# Altium footprint library SomoPowerPackControl.PcbLib: 145 footprints (part 3 of 10)
Each footprint in its own frame and in the unit in brackets; x right, y up, seen from the top. Pads: shape width x height; smd on the part's side, far side on the other; paste and mask are expansions set on the pad; w line width, h text height; cw(c..) or ccw(c..) is an arc to the next point about the centre after c.
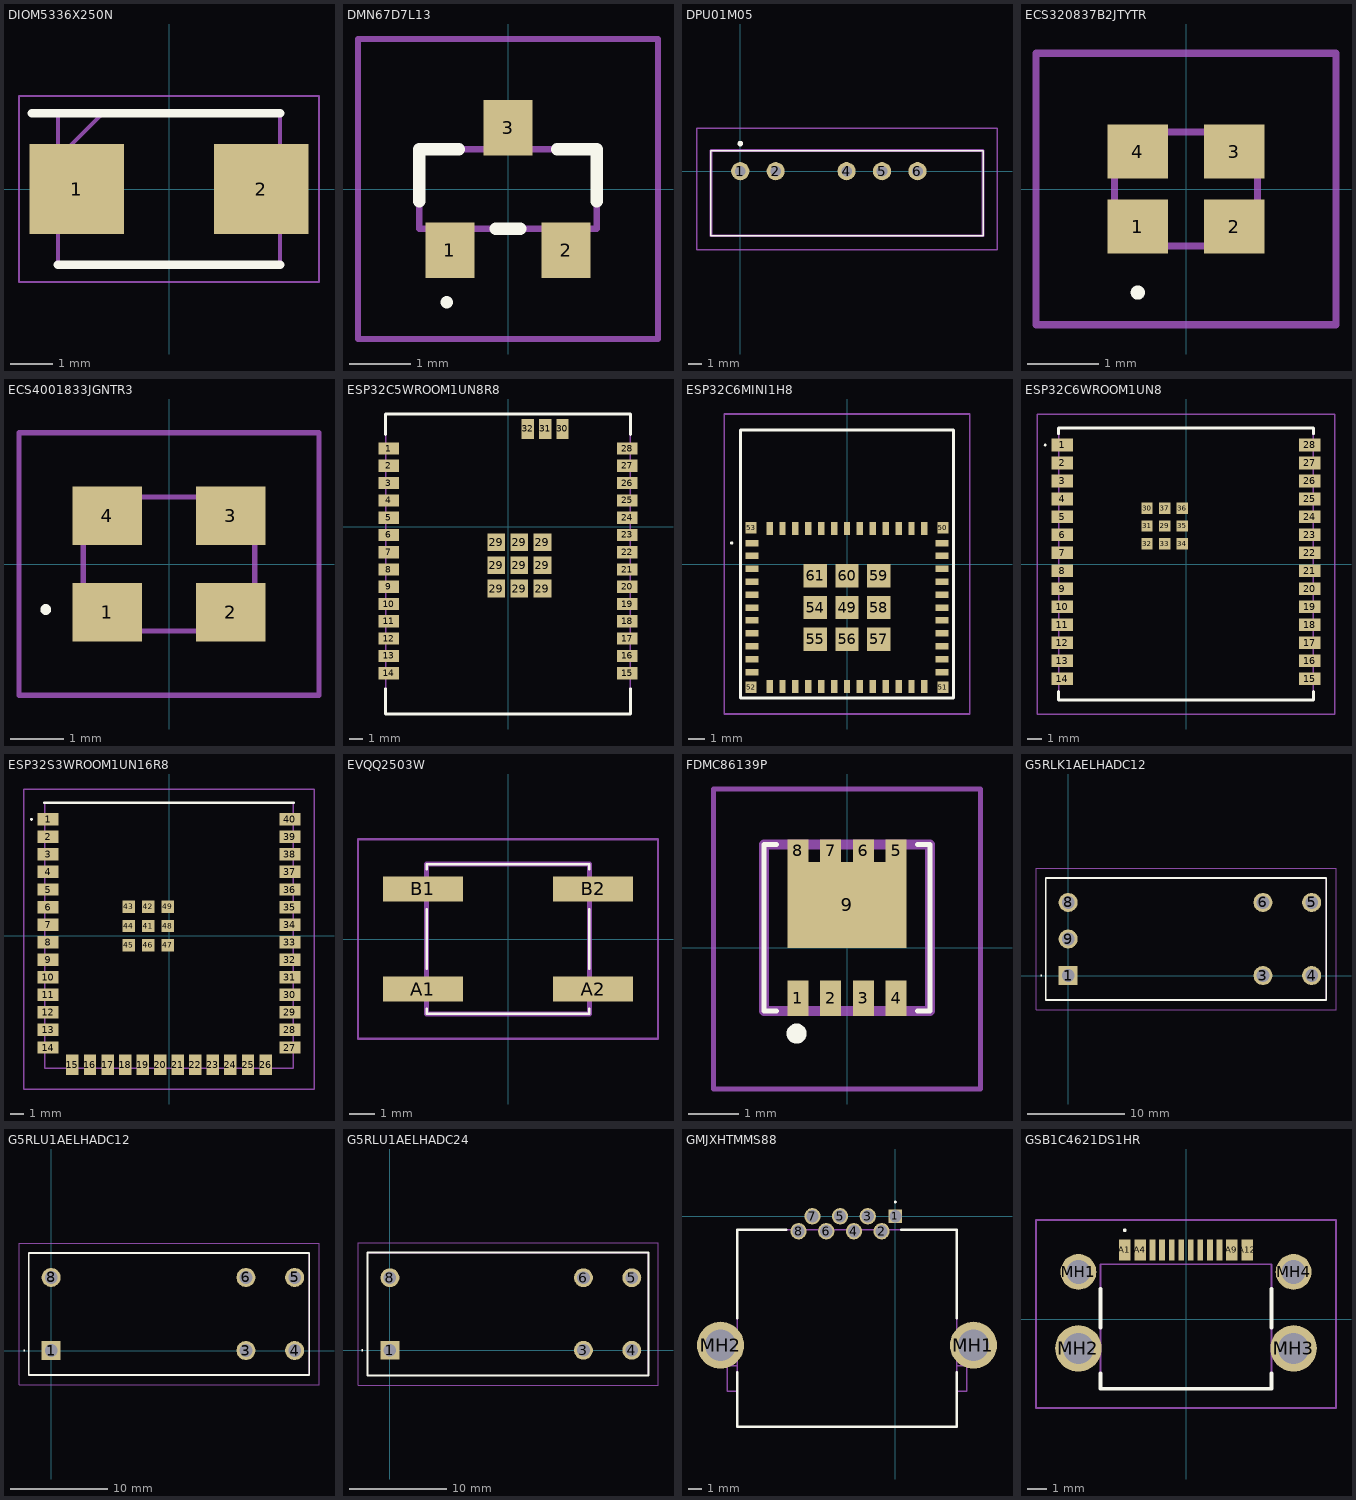
[diagram p2: the footprints below, top view; thin cyan lines are the x and y axes]

## DIOM5336X250N [mm]
pads (2):
  rect 2.25x2.15 smd: 1(-2.2,0) 2(2.2,0)
Top Overlay:
  lines w0.2: -3.275,1.81 2.648,1.81 ; -2.648,-1.81 2.648,-1.81
Mechanical 13:
  lines w0.1: -2.648,0.735 -1.572,1.81 ; -2.648,-1.81 2.648,-1.81 2.648,1.81 -2.648,1.81 -2.648,-1.81
Mechanical 15:
  lines w0.05: -3.575,-2.22 3.575,-2.22 3.575,2.22 -3.575,2.22 -3.575,-2.22
3D body "B360BQ-13-F.stp": height 2.3, standoff 0, extent -2.679,-1.752 2.681,1.748

## DMN67D7L13 [mm]
pads (3):
  rect 0.8x0.9 smd: 1(-0.95,-1) 2(0.95,-1) 3(0,1)
Top Overlay:
  lines w0.1: -1,-1.9 cw(c-1,-1.85) -1,-1.8 cw(c-1,-1.85) -1,-1.9
  lines w0.2: -1.45,-0.2 -1.45,0.65 -0.8,0.65 ; -0.2,-0.65 0.2,-0.65 ; 0.8,0.65 1.45,0.65 1.45,-0.2
Mechanical 13:
  lines w0.1: -1.45,-0.65 1.45,-0.65 1.45,0.65 -1.45,0.65 -1.45,-0.65
Mechanical 15:
  lines w0.1: -2.45,-2.45 2.45,-2.45 2.45,2.45 -2.45,2.45 -2.45,-2.45
3D body "DMN67D7L-13.stp": height 1.2, standoff 0, extent -1.45,-1.37 1.45,1.37

## DPU01M05 [mm]
pads (5):
  round 1.303 hole 0.76: 1(0,0) 2(2.54,0) 4(7.62,0) 5(10.16,0) 6(12.7,0)
Top Overlay:
  lines w0.1: -2.1,-4.625 17.4,-4.625 17.4,1.475 -2.1,1.475 -2.1,-4.625
  lines w0.2: -0.1,1.975 cw(c0,1.975) 0.1,1.975 cw(c0,1.975) -0.1,1.975
Mechanical 13:
  lines w0.2: -2.1,-4.625 17.4,-4.625 17.4,1.475 -2.1,1.475 -2.1,-4.625
Mechanical 15:
  lines w0.1: -3.1,-5.625 18.4,-5.625 18.4,3.075 -3.1,3.075 -3.1,-5.625
3D body "SPU01M-05.stp": height 10.2, standoff -3.2, extent -2.34,-5.52 17.16,1.68

## ECS320837B2JTYTR [mm]
pads (4):
  rect 0.85x0.75 smd: 1(-0.675,-0.525) 2(0.675,-0.525) 3(0.675,0.525) 4(-0.675,0.525)
Top Overlay:
  lines w0.1: -0.675,-1.5 cw(c-0.675,-1.45) -0.675,-1.4 cw(c-0.675,-1.45) -0.675,-1.5
Mechanical 13:
  lines w0.1: -1,-0.8 1,-0.8 1,0.8 -1,0.8 -1,-0.8
Mechanical 15:
  lines w0.1: -2.1,-1.9 2.1,-1.9 2.1,1.9 -2.1,1.9 -2.1,-1.9
3D body "ECS-320-8-37B2-JTY-TR.stp": height 0.6, standoff 0, extent -1.025,-0.825 1.025,0.825

## ECS4001833JGNTR3 [mm]
pads (4):
  rect 1.3x1.1 smd: 1(-1.15,-0.9) 2(1.15,-0.9) 3(1.15,0.9) 4(-1.15,0.9)
Top Overlay:
  lines w0.1: -2.3,-0.9 ccw(c-2.3,-0.85) -2.3,-0.8 ccw(c-2.3,-0.85) -2.3,-0.9
Mechanical 13:
  lines w0.1: -1.6,-1.25 1.6,-1.25 1.6,1.25 -1.6,1.25 -1.6,-1.25
Mechanical 15:
  lines w0.1: -2.8,-2.45 2.8,-2.45 2.8,2.45 -2.8,2.45 -2.8,-2.45
3D body "ECS-400-18-33-JGN-TR3.stp": height 0.9, standoff 0, extent -1.69,-1.34 1.69,1.34

## ESP32C5WROOM1UN8R8 [mm]
pads (40):
  rect 1.5x0.9 smd: 1(-8.75,5.76) 2(-8.75,4.49) 3(-8.75,3.22) 4(-8.75,1.95) 5(-8.75,0.68) 6(-8.75,-0.59) 7(-8.75,-1.86) 8(-8.75,-3.13) 9(-8.75,-4.4) 10(-8.75,-5.67) 11(-8.75,-6.94) 12(-8.75,-8.21) 13(-8.75,-9.48) 14(-8.75,-10.75) 15(8.75,-10.75) 16(8.75,-9.48) 17(8.75,-8.21) 18(8.75,-6.94) 19(8.75,-5.67) 20(8.75,-4.4) 21(8.75,-3.13) 22(8.75,-1.86) 23(8.75,-0.59) 24(8.75,0.68) 25(8.75,1.95) 26(8.75,3.22) 27(8.75,4.49) 28(8.75,5.76)
  rect 1.3x1.3 smd: 29(-0.87,-4.528) 29(-0.87,-2.828) 29(-0.87,-1.128) 29(0.83,-4.528) 29(0.83,-2.828) 29(0.83,-1.128) 29(2.53,-4.528) 29(2.53,-2.828) 29(2.53,-1.128)
  rect 0.9x1.5 smd: 30(4,7.2) 31(2.73,7.2) 32(1.46,7.2)
Top Overlay:
  lines w0.2: -9,-11.9 -9,-13.75 9,-13.75 9,-11.9 ; -9,6.8 -9,8.3 9,8.3 9,6.8
Mechanical 13:
  lines w0.1: -9,-13.75 9,-13.75 9,8.3 -9,8.3 -9,-13.75
3D body "ESP32-C5-WROOM-1-N8R8.stp": height 3.45, standoff 0, extent -9,-13.75 9,7.45

## ESP32C6MINI1H8 [mm]
pads (61):
  rect 0.8x0.4 smd: 1(-5.9,1.3) 2(-5.9,0.5) 3(-5.9,-0.3) 4(-5.9,-1.1) 5(-5.9,-1.9) 6(-5.9,-2.7) 7(-5.9,-3.5) 8(-5.9,-4.3) 9(-5.9,-5.1) 10(-5.9,-5.9) 11(-5.9,-6.7) 25(5.9,-6.7) 26(5.9,-5.9) 27(5.9,-5.1) 28(5.9,-4.3) 29(5.9,-3.5) 30(5.9,-2.7) 31(5.9,-1.9) 32(5.9,-1.1) 33(5.9,-0.3) 34(5.9,0.5) 35(5.9,1.3)
  rect 0.4x0.8 smd: 12(-4.8,-7.6) 13(-4,-7.6) 14(-3.2,-7.6) 15(-2.4,-7.6) 16(-1.6,-7.6) 17(-0.8,-7.6) 18(0,-7.6) 19(0.8,-7.6) 20(1.6,-7.6) 21(2.4,-7.6) 22(3.2,-7.6) 23(4,-7.6) 24(4.8,-7.6) 36(4.8,2.2) 37(4,2.2) 38(3.2,2.2) 39(2.4,2.2) 40(1.6,2.2) 41(0.8,2.2) 42(0,2.2) 43(-0.8,2.2) 44(-1.6,2.2) 45(-2.4,2.2) 46(-3.2,2.2) 47(-4,2.2) 48(-4.8,2.2)
  rect 1.45x1.45 smd: 49(0,-2.7) 54(-1.975,-2.7) 55(-1.975,-4.675) 56(0,-4.675) 57(1.975,-4.675) 58(1.975,-2.7) 59(1.975,-0.725) 60(0,-0.725) 61(-1.975,-0.725)
  rect 0.7x0.7 smd: 50(5.95,2.25) 51(5.95,-7.65) 52(-5.95,-7.65) 53(-5.95,2.25)
Top Overlay:
  lines w0.1: -7.2,1.3 ccw(c-7.15,1.3) -7.1,1.3 ccw(c-7.15,1.3) -7.2,1.3
  lines w0.2: -6.6,-8.3 -6.6,8.3 6.6,8.3 6.6,-8.3 -6.6,-8.3
Mechanical 13:
  lines w0.1: -6.6,-8.3 -6.6,8.3 6.6,8.3 6.6,-8.3 -6.6,-8.3
Mechanical 15:
  lines w0.1: -7.6,-9.3 -7.6,9.3 7.6,9.3 7.6,-9.3 -7.6,-9.3
3D body "ESP32-C6-MINI-1-H8.stp": height 2.55, standoff 0, extent -6.6,-8.3 6.6,8.3

## ESP32C6WROOM1UN8 [mm]
pads (37):
  rect 1.5x0.9 smd: 1(-8.75,8.41) 2(-8.75,7.14) 3(-8.75,5.87) 4(-8.75,4.6) 5(-8.75,3.33) 6(-8.75,2.06) 7(-8.75,0.79) 8(-8.75,-0.48) 9(-8.75,-1.75) 10(-8.75,-3.02) 11(-8.75,-4.29) 12(-8.75,-5.56) 13(-8.75,-6.83) 14(-8.75,-8.1) 15(8.75,-8.1) 16(8.75,-6.83) 17(8.75,-5.56) 18(8.75,-4.29) 19(8.75,-3.02) 20(8.75,-1.75) 21(8.75,-0.48) 22(8.75,0.79) 23(8.75,2.06) 24(8.75,3.33) 25(8.75,4.6) 26(8.75,5.87) 27(8.75,7.14) 28(8.75,8.41)
  rect 0.8x0.8 smd: 29(-1.505,2.69) 30(-2.755,3.94) 31(-2.755,2.69) 32(-2.755,1.44) 33(-1.505,1.44) 34(-0.255,1.44) 35(-0.255,2.69) 36(-0.255,3.94) 37(-1.505,3.94)
Top Overlay:
  lines w0.1: -10,8.41 ccw(c-9.95,8.41) -9.9,8.41 ccw(c-9.95,8.41) -10,8.41
  lines w0.2: -9,-9 -9,-9.6 9,-9.6 9,-9 ; -9,9.2 -9,9.6 9,9.6 9,9.2
Mechanical 13:
  lines w0.1: -9,-9.6 9,-9.6 9,9.6 -9,9.6 -9,-9.6
Mechanical 15:
  lines w0.1: -10.5,-10.6 10.5,-10.6 10.5,10.6 -10.5,10.6 -10.5,-10.6
3D body "ESP32-C6-WROOM-1U-N8.stp": height 3.19, standoff 0, extent -9,-9.5 9,9.5

## ESP32S3WROOM1UN16R8 [mm]
pads (49):
  rect 1.5x0.9 smd: 1(-8.75,8.41) 2(-8.75,7.14) 3(-8.75,5.87) 4(-8.75,4.6) 5(-8.75,3.33) 6(-8.75,2.06) 7(-8.75,0.79) 8(-8.75,-0.48) 9(-8.75,-1.75) 10(-8.75,-3.02) 11(-8.75,-4.29) 12(-8.75,-5.56) 13(-8.75,-6.83) 14(-8.75,-8.1) 27(8.75,-8.1) 28(8.75,-6.83) 29(8.75,-5.56) 30(8.75,-4.29) 31(8.75,-3.02) 32(8.75,-1.75) 33(8.75,-0.48) 34(8.75,0.79) 35(8.75,2.06) 36(8.75,3.33) 37(8.75,4.6) 38(8.75,5.87) 39(8.75,7.14) 40(8.75,8.41)
  rect 0.9x1.5 smd: 15(-6.985,-9.35) 16(-5.715,-9.35) 17(-4.445,-9.35) 18(-3.175,-9.35) 19(-1.905,-9.35) 20(-0.635,-9.35) 21(0.635,-9.35) 22(1.905,-9.35) 23(3.175,-9.35) 24(4.445,-9.35) 25(5.715,-9.35) 26(6.985,-9.35)
  rect 0.9x0.9 smd: 41(-1.5,0.69) 42(-1.5,2.09) 43(-2.9,2.09) 44(-2.9,0.69) 45(-2.9,-0.71) 46(-1.5,-0.71) 47(-0.1,-0.71) 48(-0.1,0.69) 49(-0.1,2.09)
Top Overlay:
  lines w0.1: -10,8.4 ccw(c-9.95,8.4) -9.9,8.4 ccw(c-9.95,8.4) -10,8.4
  lines w0.2: -9,9.6 9,9.6
Mechanical 13:
  lines w0.1: -9,-9.6 9,-9.6 9,9.6 -9,9.6 -9,-9.6
Mechanical 15:
  lines w0.1: -10.5,-11.1 10.5,-11.1 10.5,10.6 -10.5,10.6 -10.5,-11.1
3D body "ESP32-S3-WROOM-1U-N16R8.stp": height 3.35, standoff 0, extent -9,-9.85 9,9.35

## EVQQ2503W [mm]
pads (4):
  rect 3.2x1 smd: A1(-3.4,-2) A2(3.4,-2) B1(-3.4,2) B2(3.4,2)
Top Overlay:
  lines w0.1: -3.25,-2.8 -3.25,-3 3.25,-3 3.25,-2.8 ; -3.25,-1.2 -3.25,1.2 ; -3.25,2.8 -3.25,3 3.25,3 3.25,2.8 ; 3.25,-1.2 3.25,1.2
Mechanical 13:
  lines w0.2: -3.25,-3 -3.25,3 3.25,3 3.25,-3 -3.25,-3
Mechanical 15:
  lines w0.1: -6,-4 -6,4 6,4 6,-4 -6,-4
3D body "EVQ-Q2503W.stp": height 3.1, standoff 0, extent -3.3,-3 3.3,3

## FDMC86139P [mm]
pads (9):
  rect 0.42x0.7 smd: 1(-0.975,-1) 2(-0.325,-1) 3(0.325,-1) 4(0.975,-1)
  rect 0.42x0.45 smd: 5(0.975,1.925) 6(0.325,1.925) 7(-0.325,1.925) 8(-0.975,1.925)
  rect 2.37x1.7 smd: 9(0,0.85)
Top Overlay:
  lines w0.1: -1.4,-1.25 -1.65,-1.25 -1.65,2.05 -1.4,2.05 ; 1.4,-1.25 1.65,-1.25 1.65,2.05 1.4,2.05
  lines w0.2: -1.1,-1.7 ccw(c-1,-1.7) -0.9,-1.7 ccw(c-1,-1.7) -1.1,-1.7
Mechanical 13:
  lines w0.2: -1.65,-1.25 -1.65,2.05 1.65,2.05 1.65,-1.25 -1.65,-1.25
Mechanical 15:
  lines w0.1: -2.65,-2.8 -2.65,3.15 2.65,3.15 2.65,-2.8 -2.65,-2.8
3D body "FDMC86262P.stp": height 0.85, standoff 0, extent -1.65,-1.25 1.65,2.05

## G5RLK1AELHADC12 [mm]
pads (7):
  rect 1.95x1.95 hole 1.3: 1(0,0)
  round 1.95 hole 1.3: 3(20,0) 4(25,0) 5(25,7.5) 6(20,7.5) 8(0,7.5) 9(0,3.75)
Top Overlay:
  lines w0.1: -2.8,0 cw(c-2.75,0) -2.7,0 cw(c-2.75,0) -2.8,0
  lines w0.2: -2.1,10 -2.3,10 ; -2.3,10 26.5,10 26.5,-2.5 -2.3,-2.5 -2.3,10
Mechanical 13:
  lines w0.1: -2.3,-2.5 -2.3,10 26.5,10 26.5,-2.5 -2.3,-2.5
Mechanical 15:
  lines w0.1: -3.3,-3.5 -3.3,11 27.5,11 27.5,-3.5 -3.3,-3.5
3D body "G5RL-U1A-EL-HA_DC12.stp": height 15.8, standoff -5, extent -2.3,-2.5 26.5,10

## G5RLU1AELHADC12 [mm]
pads (6):
  rect 1.95x1.95 hole 1.3: 1(0,0)
  round 1.95 hole 1.3: 3(20,0) 4(25,0) 5(25,7.5) 6(20,7.5) 8(0,7.5)
Top Overlay:
  lines w0.1: -2.8,0 cw(c-2.75,0) -2.7,0 cw(c-2.75,0) -2.8,0
  lines w0.2: -2.1,10 -2.3,10 ; -2.3,10 26.5,10 26.5,-2.5 -2.3,-2.5 -2.3,10
Mechanical 13:
  lines w0.1: -2.3,-2.5 -2.3,10 26.5,10 26.5,-2.5 -2.3,-2.5
Mechanical 15:
  lines w0.1: -3.3,-3.5 -3.3,11 27.5,11 27.5,-3.5 -3.3,-3.5
3D body "G5RL-U1A-EL-HA_DC12.stp": height 15.8, standoff -5, extent -2.3,-2.5 26.5,10

## G5RLU1AELHADC24 [mm]
pads (6):
  rect 1.95x1.95 hole 1.3: 1(0,0)
  round 1.95 hole 1.3: 3(20,0) 4(25,0) 5(25,7.5) 6(20,7.5) 8(0,7.5)
Top Overlay:
  lines w0.1: -2.9,0 cw(c-2.85,0) -2.8,0 cw(c-2.85,0) -2.9,0
  lines w0.2: -2.3,-2.6 26.7,-2.6 26.7,10.1 -2.3,10.1 -2.3,-2.6
Mechanical 13:
  lines w0.1: -2.3,-2.6 26.7,-2.6 26.7,10.1 -2.3,10.1 -2.3,-2.6
Mechanical 15:
  lines w0.1: -3.3,-3.6 27.7,-3.6 27.7,11.1 -3.3,11.1 -3.3,-3.6
3D body "G5RL-U1A-EL-HA_DC24.stp": height 15.8, standoff -5, extent -2.3,-2.6 26.7,10.1

## GMJXHTMMS88 [mm]
pads (10):
  rect 1x1 hole 0.9: 1(0,0)
  round 1.2 hole 0.9: 2(-1.02,-1.1) 3(-2.04,0) 4(-3.06,-1.1) 5(-4.08,0) 6(-5.1,-1.1) 7(-6.12,0) 8(-7.14,-1.1)
  round 3.465 hole 2.31: MH1(5.751,-9.5) MH2(-12.889,-9.5)
Top Overlay:
  lines w0.1: 0,1 cw(c0,1.05) 0,1.1 cw(c0,1.05) 0,1
  lines w0.2: -11.659,-11.5 -11.659,-15.5 4.521,-15.5 4.521,-11.5 ; -11.659,-7.5 -11.659,-1 -8.069,-1 ; 0.43,-1 4.521,-1 4.521,-7.5
Mechanical 13:
  lines w0.1: -11.659,-12.9 -12.409,-12.9 -12.409,-11 -11.659,-11 ; 4.521,-12.9 5.271,-12.9 5.271,-11 4.521,-11 ; -11.659,-15.5 -11.659,-1 4.521,-1 4.521,-15.5 -11.659,-15.5
3D body "GMJXHT-MM-S-88.STEP": height 8.8, standoff -1.9, extent -13.065,-15.338 6.065,0.337

## GSB1C4621DS1HR [mm]
pads (16):
  rect 0.6x1.1 smd: A1(-3.2,3.625) A4(-2.4,3.625) A9(2.4,3.625) A12(3.2,3.625)
  rect 0.3x1.1 smd: A5(-1.25,3.625) A6(-0.25,3.625) A7(0.25,3.625) A8(1.25,3.625) B5(1.75,3.625) B6(0.75,3.625) B7(-0.75,3.625) B8(-1.75,3.625)
  round 1.875 hole 1.25: MH1(-5.62,2.475) MH4(5.62,2.475)
  round 2.43 hole 1.62: MH2(-5.62,-1.525) MH3(5.62,-1.525)
Top Overlay:
  lines w0.1: -3.2,4.6 cw(c-3.2,4.65) -3.2,4.7 cw(c-3.2,4.65) -3.2,4.6
  lines w0.2: -4.47,-2.825 -4.47,-3.625 4.47,-3.625 4.47,-2.825 ; -4.47,-0.425 -4.47,1.575 ; 4.47,-0.425 4.47,1.575
Mechanical 13:
  lines w0.1: -4.47,-3.625 -4.47,2.875 4.47,2.875 4.47,-3.625 -4.47,-3.625
Mechanical 15:
  lines w0.1: -7.835,-4.625 -7.835,5.175 7.835,5.175 7.835,-4.625 -7.835,-4.625
3D body "GSB1C4621DS1HR.stp": height 2.1, standoff -1.09, extent -5.77,-3.328 5.77,3.872